# Altium schematic symbol library Regulator_Linear.SchLib: 1452 symbols (part 4 of 10) (continued)
## LM7805_TO220
designator *  value LM7805_TO220
ki_keywords: Voltage Regulator 1A Positive; ki_description: Positive 1A 35V Linear Regulator, Fixed Output 5V, TO-220; ki_fp_filters: TO?220*; Footprint: Package_TO_SOT_THT:TO-220-3_Vertical; Supplier: https://www.onsemi.cn/PowerSolutions/document/MC7800-D.PDF
footprint TO-220-3_Vertical
pins: 1 VI (power), 2 GND (power), 3 VO (power)

## LM7806_TO220
designator *  value LM7806_TO220
ki_keywords: Voltage Regulator 1A Positive; ki_description: Positive 1A 35V Linear Regulator, Fixed Output 6V, TO-220; ki_fp_filters: TO?220*; Footprint: Package_TO_SOT_THT:TO-220-3_Vertical; Supplier: https://www.onsemi.cn/PowerSolutions/document/MC7800-D.PDF
footprint TO-220-3_Vertical
pins: 1 VI (power), 2 GND (power), 3 VO (power)

## LM7808_TO220
designator *  value LM7808_TO220
ki_keywords: Voltage Regulator 1A Positive; ki_description: Positive 1A 35V Linear Regulator, Fixed Output 8V, TO-220; ki_fp_filters: TO?220*; Footprint: Package_TO_SOT_THT:TO-220-3_Vertical; Supplier: https://www.onsemi.cn/PowerSolutions/document/MC7800-D.PDF
footprint TO-220-3_Vertical
pins: 1 VI (power), 2 GND (power), 3 VO (power)

## LM7809_TO220
designator *  value LM7809_TO220
ki_keywords: Voltage Regulator 1A Positive; ki_description: Positive 1A 35V Linear Regulator, Fixed Output 9V, TO-220; ki_fp_filters: TO?220*; Footprint: Package_TO_SOT_THT:TO-220-3_Vertical; Supplier: https://www.onsemi.cn/PowerSolutions/document/MC7800-D.PDF
footprint TO-220-3_Vertical
pins: 1 VI (power), 2 GND (power), 3 VO (power)

## LM7810_TO220
designator *  value LM7810_TO220
ki_keywords: Voltage Regulator 1A Positive; ki_description: Positive 1A 35V Linear Regulator, Fixed Output 10V, TO-220; ki_fp_filters: TO?220*; Footprint: Package_TO_SOT_THT:TO-220-3_Vertical; Supplier: https://www.onsemi.cn/PowerSolutions/document/MC7800-D.PDF
footprint TO-220-3_Vertical
pins: 1 VI (power), 2 GND (power), 3 VO (power)

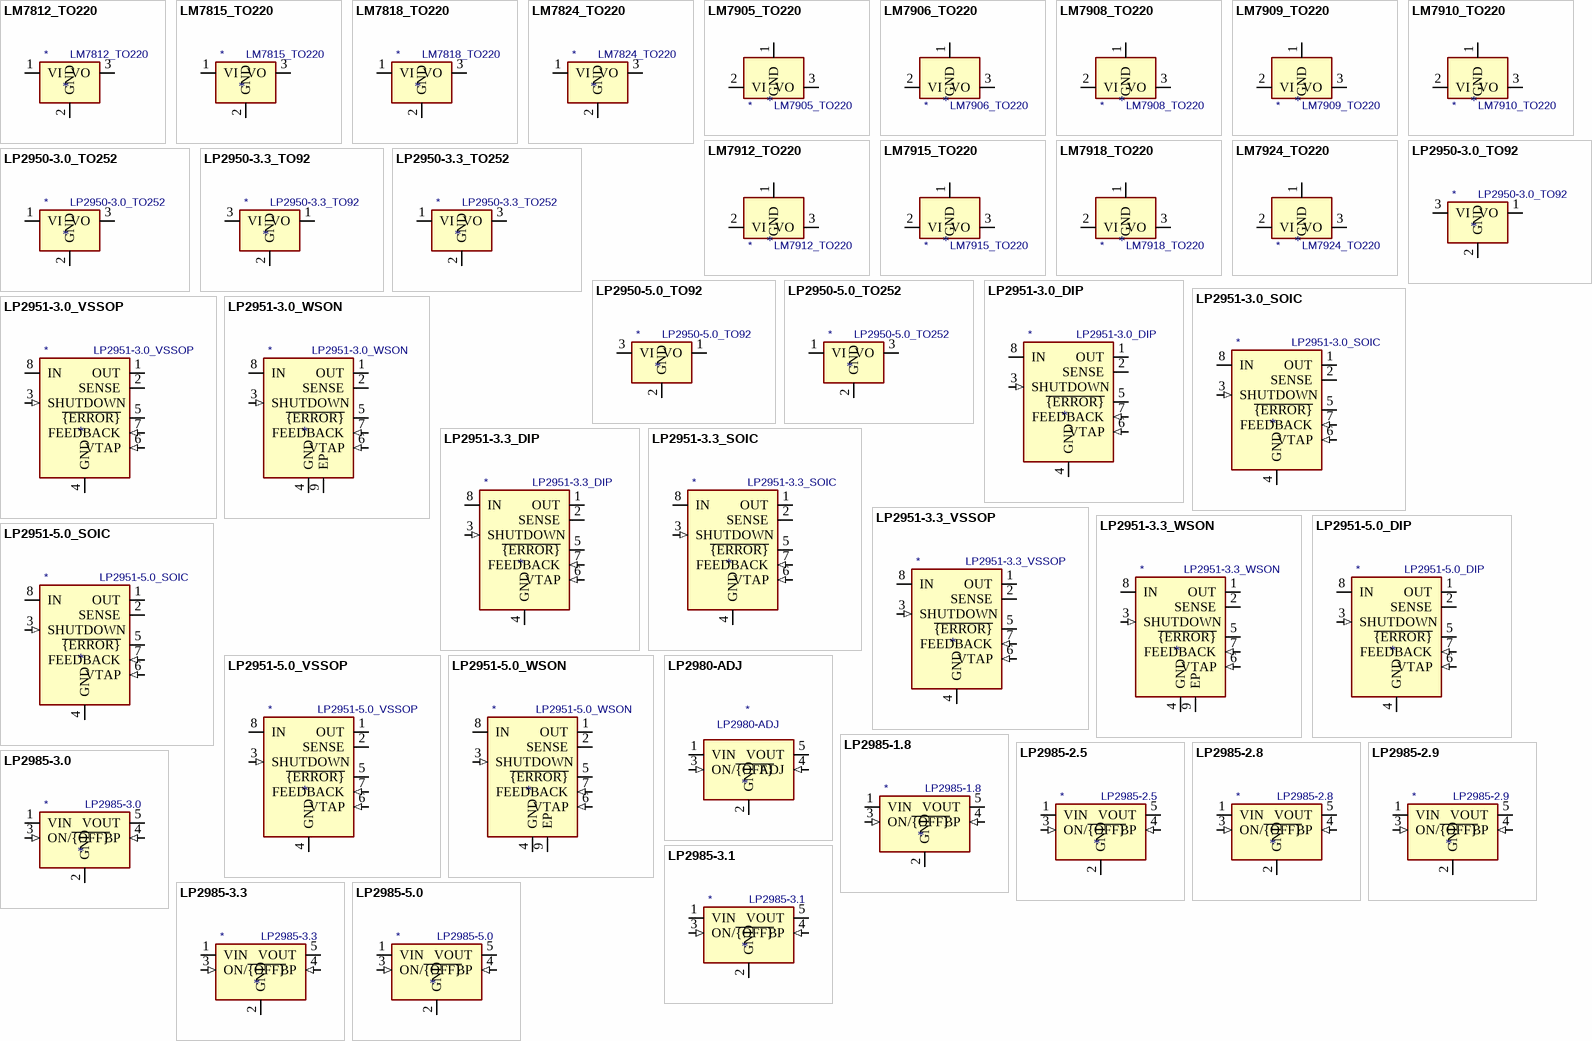
[diagram p14: symbols LM7812_TO220 to LP2985-5.0]

## LM7812_TO220
designator *  value LM7812_TO220
ki_keywords: Voltage Regulator 1A Positive; ki_description: Positive 1A 35V Linear Regulator, Fixed Output 12V, TO-220; ki_fp_filters: TO?220*; Footprint: Package_TO_SOT_THT:TO-220-3_Vertical; Supplier: https://www.onsemi.cn/PowerSolutions/document/MC7800-D.PDF
footprint TO-220-3_Vertical
pins: 1 VI (power), 2 GND (power), 3 VO (power)

## LM7815_TO220
designator *  value LM7815_TO220
ki_keywords: Voltage Regulator 1A Positive; ki_description: Positive 1A 35V Linear Regulator, Fixed Output 15V, TO-220; ki_fp_filters: TO?220*; Footprint: Package_TO_SOT_THT:TO-220-3_Vertical; Supplier: https://www.onsemi.cn/PowerSolutions/document/MC7800-D.PDF
footprint TO-220-3_Vertical
pins: 1 VI (power), 2 GND (power), 3 VO (power)

## LM7818_TO220
designator *  value LM7818_TO220
ki_keywords: Voltage Regulator 1A Positive; ki_description: Positive 1A 35V Linear Regulator, Fixed Output 18V, TO-220; ki_fp_filters: TO?220*; Footprint: Package_TO_SOT_THT:TO-220-3_Vertical; Supplier: https://www.onsemi.cn/PowerSolutions/document/MC7800-D.PDF
footprint TO-220-3_Vertical
pins: 1 VI (power), 2 GND (power), 3 VO (power)

## LM7824_TO220
designator *  value LM7824_TO220
ki_keywords: Voltage Regulator 1A Positive; ki_description: Positive 1A 35V Linear Regulator, Fixed Output 24V, TO-220; ki_fp_filters: TO?220*; Footprint: Package_TO_SOT_THT:TO-220-3_Vertical; Supplier: https://www.onsemi.cn/PowerSolutions/document/MC7800-D.PDF
footprint TO-220-3_Vertical
pins: 1 VI (power), 2 GND (power), 3 VO (power)

## LM7905_TO220
designator *  value LM7905_TO220
ki_keywords: Voltage Regulator 1A Negative; ki_description: Negative 1A 35V Linear Regulator, Fixed Output 5V, TO-220; ki_fp_filters: TO?220*; Footprint: Package_TO_SOT_THT:TO-220-3_Vertical; Supplier: https://www.onsemi.com/pub/Collateral/MC7900-D.PDF
footprint TO-220-3_Vertical
pins: 1 GND (power), 2 VI (power), 3 VO (power)

## LM7906_TO220
designator *  value LM7906_TO220
ki_keywords: Voltage Regulator 1A Negative; ki_description: Negative 1A 35V Linear Regulator, Fixed Output 6V, TO-220; ki_fp_filters: TO?220*; Footprint: Package_TO_SOT_THT:TO-220-3_Vertical; Supplier: https://www.onsemi.com/pub/Collateral/MC7900-D.PDF
footprint TO-220-3_Vertical
pins: 1 GND (power), 2 VI (power), 3 VO (power)

## LM7908_TO220
designator *  value LM7908_TO220
ki_keywords: Voltage Regulator 1A Negative; ki_description: Negative 1A 35V Linear Regulator, Fixed Output 8V, TO-220; ki_fp_filters: TO?220*; Footprint: Package_TO_SOT_THT:TO-220-3_Vertical; Supplier: https://www.onsemi.com/pub/Collateral/MC7900-D.PDF
footprint TO-220-3_Vertical
pins: 1 GND (power), 2 VI (power), 3 VO (power)

## LM7909_TO220
designator *  value LM7909_TO220
ki_keywords: Voltage Regulator 1A Negative; ki_description: Negative 1A 35V Linear Regulator, Fixed Output 9V, TO-220; ki_fp_filters: TO?220*; Footprint: Package_TO_SOT_THT:TO-220-3_Vertical; Supplier: https://www.onsemi.com/pub/Collateral/MC7900-D.PDF
footprint TO-220-3_Vertical
pins: 1 GND (power), 2 VI (power), 3 VO (power)

## LM7910_TO220
designator *  value LM7910_TO220
ki_keywords: Voltage Regulator 1A Negative; ki_description: Negative 1A 35V Linear Regulator, Fixed Output 10V, TO-220; ki_fp_filters: TO?220*; Footprint: Package_TO_SOT_THT:TO-220-3_Vertical; Supplier: https://www.onsemi.com/pub/Collateral/MC7900-D.PDF
footprint TO-220-3_Vertical
pins: 1 GND (power), 2 VI (power), 3 VO (power)

## LM7912_TO220
designator *  value LM7912_TO220
ki_keywords: Voltage Regulator 1A Negative; ki_description: Negative 1A 35V Linear Regulator, Fixed Output 12V, TO-220; ki_fp_filters: TO?220*; Footprint: Package_TO_SOT_THT:TO-220-3_Vertical; Supplier: hhttps://www.onsemi.com/pub/Collateral/MC7900-D.PDF
footprint TO-220-3_Vertical
pins: 1 GND (power), 2 VI (power), 3 VO (power)

## LM7915_TO220
designator *  value LM7915_TO220
ki_keywords: Voltage Regulator 1A Negative; ki_description: Negative 1A 35V Linear Regulator, Fixed Output 15V, TO-220; ki_fp_filters: TO?220*; Footprint: Package_TO_SOT_THT:TO-220-3_Vertical; Supplier: https://www.onsemi.com/pub/Collateral/MC7900-D.PDF
footprint TO-220-3_Vertical
pins: 1 GND (power), 2 VI (power), 3 VO (power)

## LM7918_TO220
designator *  value LM7918_TO220
ki_keywords: Voltage Regulator 1A Negative; ki_description: Negative 1A 35V Linear Regulator, Fixed Output 18V, TO-220; ki_fp_filters: TO?220*; Footprint: Package_TO_SOT_THT:TO-220-3_Vertical; Supplier: https://www.onsemi.com/pub/Collateral/MC7900-D.PDF
footprint TO-220-3_Vertical
pins: 1 GND (power), 2 VI (power), 3 VO (power)

## LM7924_TO220
designator *  value LM7924_TO220
ki_keywords: Voltage Regulator 1A Negative; ki_description: Negative 1A 35V Linear Regulator, Fixed Output 24V, TO-220; ki_fp_filters: TO?220*; Footprint: Package_TO_SOT_THT:TO-220-3_Vertical; Supplier: https://www.onsemi.com/pub/Collateral/MC7900-D.PDF
footprint TO-220-3_Vertical
pins: 1 GND (power), 2 VI (power), 3 VO (power)

## LP2950-3.0_TO92
designator *  value LP2950-3.0_TO92
ki_keywords: Micropower Voltage Regulator 100mA Positive; ki_description: Positive 100mA 30V Linear Micropower Voltage Regulator, Fixed Output 3.0V, TO-92; ki_fp_filters: TO?92*; Footprint: Package_TO_SOT_THT:TO-92_Inline; Supplier: http://www.ti.com/lit/ds/symlink/lp2950.pdf
footprint TO-92_Inline
pins: 1 VO (power), 2 GND (power), 3 VI (power)

## LP2950-3.0_TO252
designator *  value LP2950-3.0_TO252
ki_keywords: Micropower Voltage Regulator 100mA Positive; ki_description: Positive 100mA 30V Linear Micropower Voltage Regulator, Fixed Output 3.0V, TO-252; ki_fp_filters: TO?252*; Footprint: Package_TO_SOT_SMD:TO-252-2; Supplier: http://www.ti.com/lit/ds/symlink/lp2950.pdf
footprint TO-252-2
pins: 1 VI (power), 2 GND (power), 3 VO (power)

## LP2950-3.3_TO92
designator *  value LP2950-3.3_TO92
ki_keywords: Micropower Voltage Regulator 100mA Positive; ki_description: Positive 100mA 30V Linear Micropower Voltage Regulator, Fixed Output 3.3V, TO-92; ki_fp_filters: TO?92*; Footprint: Package_TO_SOT_THT:TO-92_Inline; Supplier: http://www.ti.com/lit/ds/symlink/lp2950.pdf
footprint TO-92_Inline
pins: 1 VO (power), 2 GND (power), 3 VI (power)

## LP2950-3.3_TO252
designator *  value LP2950-3.3_TO252
ki_keywords: Micropower Voltage Regulator 100mA Positive; ki_description: Positive 100mA 30V Linear Micropower Voltage Regulator, Fixed Output 3.3V, TO-252; ki_fp_filters: TO?252*; Footprint: Package_TO_SOT_SMD:TO-252-2; Supplier: http://www.ti.com/lit/ds/symlink/lp2950.pdf
footprint TO-252-2
pins: 1 VI (power), 2 GND (power), 3 VO (power)

## LP2950-5.0_TO92
designator *  value LP2950-5.0_TO92
ki_keywords: Micropower Voltage Regulator 100mA Positive; ki_description: Micropower Voltage Regulators with Shutdown, 100mA, Fixed Output 5.0V, TO-92; ki_fp_filters: TO?92*; Footprint: Package_TO_SOT_THT:TO-92_Inline; Supplier: http://www.ti.com/lit/ds/symlink/lp2951.pdf
footprint TO-92_Inline
pins: 1 VO (power), 2 GND (power), 3 VI (power)

## LP2950-5.0_TO252
designator *  value LP2950-5.0_TO252
ki_keywords: Micropower Voltage Regulator 100mA Positive; ki_description: Positive 100mA 30V Linear Micropower Voltage Regulator, Fixed Output 5.0V, TO-252; ki_fp_filters: TO?252*; Footprint: Package_TO_SOT_SMD:TO-252-2; Supplier: http://www.ti.com/lit/ds/symlink/lp2950.pdf
footprint TO-252-2
pins: 1 VI (power), 2 GND (power), 3 VO (power)

## LP2951-3.0_DIP
designator *  value LP2951-3.0_DIP
ki_keywords: Micropower Voltage Regulators with Shutdown; ki_description: Micropower Voltage Regulators with Shutdown, 100mA, Fixed Output 3.0V, LDO, DIP-8; ki_fp_filters: DIP*W7.62mm*; Footprint: Package_DIP:DIP-8_W7.62mm; Supplier: http://www.ti.com/lit/ds/symlink/lp2951.pdf
footprint DIP-8_W7.62mm
pins: 1 OUT (power), 2 SENSE, 3 SHUTDOWN (in), 4 GND (power), 5 ~{{ERROR}} (oc), 6 VTAP (in), 7 FEEDBACK (in), 8 IN (power)

## LP2951-3.0_SOIC
designator *  value LP2951-3.0_SOIC
ki_keywords: Micropower Voltage Regulators with Shutdown; ki_description: Micropower Voltage Regulators with Shutdown, 100mA, Fixed Output 3.0V, LDO, SOIC-8; ki_fp_filters: SOIC*3.9x4.9mm*P1.27mm*; Footprint: Package_SO:SOIC-8_3.9x4.9mm_P1.27mm; Supplier: http://www.ti.com/lit/ds/symlink/lp2951.pdf
footprint SOIC-8_3.9x4.9mm_P1.27mm
pins: 1 OUT (power), 2 SENSE, 3 SHUTDOWN (in), 4 GND (power), 5 ~{{ERROR}} (oc), 6 VTAP (in), 7 FEEDBACK (in), 8 IN (power)

## LP2951-3.0_VSSOP
designator *  value LP2951-3.0_VSSOP
ki_keywords: Micropower Voltage Regulators with Shutdown; ki_description: Micropower Voltage Regulators with Shutdown, 100mA, Fixed Output 3.0V, LDO, VSSOP-8; ki_fp_filters: VSSOP*3.0x3.0mm*P0.65mm*; Footprint: Package_SO:VSSOP-8_3.0x3.0mm_P0.65mm; Supplier: http://www.ti.com/lit/ds/symlink/lp2951.pdf
footprint VSSOP-8_3.0x3.0mm_P0.65mm
pins: 1 OUT (power), 2 SENSE, 3 SHUTDOWN (in), 4 GND (power), 5 ~{{ERROR}} (oc), 6 VTAP (in), 7 FEEDBACK (in), 8 IN (power)

## LP2951-3.0_WSON
designator *  value LP2951-3.0_WSON
ki_keywords: Micropower Voltage Regulators with Shutdown; ki_description: Micropower Voltage Regulators with Shutdown, 100mA, Fixed Output 3.0V, LDO, WSON-8; ki_fp_filters: WSON*1EP*3x3mm*P0.5mm*; Footprint: Package_SON:WSON-8-1EP_3x3mm_P0.5mm_EP1.2x2mm; Supplier: http://www.ti.com/lit/ds/symlink/lp2951.pdf
footprint WSON-8-1EP_3x3mm_P0.5mm_EP1.2x2mm
pins: 1 OUT (power), 2 SENSE, 3 SHUTDOWN (in), 4 GND (power), 5 ~{{ERROR}} (oc), 6 VTAP (in), 7 FEEDBACK (in), 8 IN (power), 9 EP

## LP2951-3.3_DIP
designator *  value LP2951-3.3_DIP
ki_keywords: Micropower Voltage Regulators with Shutdown; ki_description: Micropower Voltage Regulators with Shutdown, 100mA, Fixed Output 3.3V, LDO, DIP-8; ki_fp_filters: DIP*W7.62mm*; Footprint: Package_DIP:DIP-8_W7.62mm; Supplier: http://www.ti.com/lit/ds/symlink/lp2951.pdf
footprint DIP-8_W7.62mm
pins: 1 OUT (power), 2 SENSE, 3 SHUTDOWN (in), 4 GND (power), 5 ~{{ERROR}} (oc), 6 VTAP (in), 7 FEEDBACK (in), 8 IN (power)

## LP2951-3.3_SOIC
designator *  value LP2951-3.3_SOIC
ki_keywords: Micropower Voltage Regulators with Shutdown; ki_description: Micropower Voltage Regulators with Shutdown, 100mA, Fixed Output 3.3V, LDO, SOIC-8; ki_fp_filters: SOIC*3.9x4.9mm*P1.27mm*; Footprint: Package_SO:SOIC-8_3.9x4.9mm_P1.27mm; Supplier: http://www.ti.com/lit/ds/symlink/lp2951.pdf
footprint SOIC-8_3.9x4.9mm_P1.27mm
pins: 1 OUT (power), 2 SENSE, 3 SHUTDOWN (in), 4 GND (power), 5 ~{{ERROR}} (oc), 6 VTAP (in), 7 FEEDBACK (in), 8 IN (power)

## LP2951-3.3_VSSOP
designator *  value LP2951-3.3_VSSOP
ki_keywords: Micropower Voltage Regulators with Shutdown; ki_description: Micropower Voltage Regulators with Shutdown, 100mA, Fixed Output 3.3V, LDO, VSSOP-8; ki_fp_filters: VSSOP*3.0x3.0mm*P0.65mm*; Footprint: Package_SO:VSSOP-8_3.0x3.0mm_P0.65mm; Supplier: http://www.ti.com/lit/ds/symlink/lp2951.pdf
footprint VSSOP-8_3.0x3.0mm_P0.65mm
pins: 1 OUT (power), 2 SENSE, 3 SHUTDOWN (in), 4 GND (power), 5 ~{{ERROR}} (oc), 6 VTAP (in), 7 FEEDBACK (in), 8 IN (power)

## LP2951-3.3_WSON
designator *  value LP2951-3.3_WSON
ki_keywords: Micropower Voltage Regulators with Shutdown; ki_description: Micropower Voltage Regulators with Shutdown, 100mA, Fixed Output 3.3V, LDO, WSON-8; ki_fp_filters: WSON*1EP*3x3mm*P0.5mm*; Footprint: Package_SON:WSON-8-1EP_3x3mm_P0.5mm_EP1.2x2mm; Supplier: http://www.ti.com/lit/ds/symlink/lp2951.pdf
footprint WSON-8-1EP_3x3mm_P0.5mm_EP1.2x2mm
pins: 1 OUT (power), 2 SENSE, 3 SHUTDOWN (in), 4 GND (power), 5 ~{{ERROR}} (oc), 6 VTAP (in), 7 FEEDBACK (in), 8 IN (power), 9 EP

## LP2951-5.0_DIP
designator *  value LP2951-5.0_DIP
ki_keywords: Micropower Voltage Regulators with Shutdown; ki_description: Micropower Voltage Regulators with Shutdown, 100mA, Fixed Output 5.0V, LDO, DIP-8; ki_fp_filters: DIP*W7.62mm*; Footprint: Package_DIP:DIP-8_W7.62mm; Supplier: http://www.ti.com/lit/ds/symlink/lp2951.pdf
footprint DIP-8_W7.62mm
pins: 1 OUT (power), 2 SENSE, 3 SHUTDOWN (in), 4 GND (power), 5 ~{{ERROR}} (oc), 6 VTAP (in), 7 FEEDBACK (in), 8 IN (power)

## LP2951-5.0_SOIC
designator *  value LP2951-5.0_SOIC
ki_keywords: Micropower Voltage Regulators with Shutdown; ki_description: Micropower Voltage Regulators with Shutdown, 100mA, Fixed Output 5.0V, LDO, SOIC-8; ki_fp_filters: SOIC*3.9x4.9mm*P1.27mm*; Footprint: Package_SO:SOIC-8_3.9x4.9mm_P1.27mm; Supplier: http://www.ti.com/lit/ds/symlink/lp2951.pdf
footprint SOIC-8_3.9x4.9mm_P1.27mm
pins: 1 OUT (power), 2 SENSE, 3 SHUTDOWN (in), 4 GND (power), 5 ~{{ERROR}} (oc), 6 VTAP (in), 7 FEEDBACK (in), 8 IN (power)

## LP2951-5.0_VSSOP
designator *  value LP2951-5.0_VSSOP
ki_keywords: Micropower Voltage Regulators with Shutdown; ki_description: Micropower Voltage Regulators with Shutdown, 100mA, Fixed Output 5.0V, LDO, VSSOP-8; ki_fp_filters: VSSOP*3.0x3.0mm*P0.65mm*; Footprint: Package_SO:VSSOP-8_3.0x3.0mm_P0.65mm; Supplier: http://www.ti.com/lit/ds/symlink/lp2951.pdf
footprint VSSOP-8_3.0x3.0mm_P0.65mm
pins: 1 OUT (power), 2 SENSE, 3 SHUTDOWN (in), 4 GND (power), 5 ~{{ERROR}} (oc), 6 VTAP (in), 7 FEEDBACK (in), 8 IN (power)

## LP2951-5.0_WSON
designator *  value LP2951-5.0_WSON
ki_keywords: Micropower Voltage Regulators with Shutdown; ki_description: Micropower Voltage Regulators with Shutdown, 100mA, Fixed Output 5.0V, LDO, WSON-8; ki_fp_filters: WSON*1EP*3x3mm*P0.5mm*; Footprint: Package_SON:WSON-8-1EP_3x3mm_P0.5mm_EP1.2x2mm; Supplier: http://www.ti.com/lit/ds/symlink/lp2951.pdf
footprint WSON-8-1EP_3x3mm_P0.5mm_EP1.2x2mm
pins: 1 OUT (power), 2 SENSE, 3 SHUTDOWN (in), 4 GND (power), 5 ~{{ERROR}} (oc), 6 VTAP (in), 7 FEEDBACK (in), 8 IN (power), 9 EP

## LP2980-ADJ
designator *  value LP2980-ADJ
ki_keywords: LDO Voltage Regulator 50mA Positive; ki_description: 50mA 15V Low-noise Low-dropout Regulator, 1.23-15V adjustable output voltage, SOT-23-5; ki_fp_filters: SOT?23*; Footprint: Package_TO_SOT_SMD:SOT-23-5; Supplier: http://www.ti.com/lit/ds/symlink/lp2980-adj.pdf
footprint SOT-23-5
pins: 1 VIN (power), 2 GND (power), 3 ON/~{{OFF}} (in), 4 ADJ (in), 5 VOUT (power)

## LP2985-1.8
designator *  value LP2985-1.8
ki_keywords: LDO regulator linear  SOT-23-5; ki_description: 150mA 16V Low-noise Low-dropout Regulator With Shutdown, 1.8V output voltage, SOT-23-5; ki_fp_filters: SOT?23*; Footprint: Package_TO_SOT_SMD:SOT-23-5; Supplier: http://www.ti.com/lit/ds/symlink/lp2985.pdf
footprint SOT-23-5
pins: 1 VIN (power), 2 GND (power), 3 ON/~{{OFF}} (in), 4 BP (in), 5 VOUT (power)

## LP2985-2.5
designator *  value LP2985-2.5
ki_keywords: LDO regulator linear  SOT-23-5; ki_description: 150mA 16V Low-noise Low-dropout Regulator With Shutdown, 2.5V output voltage, SOT-23-5; ki_fp_filters: SOT?23*; Footprint: Package_TO_SOT_SMD:SOT-23-5; Supplier: http://www.ti.com/lit/ds/symlink/lp2985.pdf
footprint SOT-23-5
pins: 1 VIN (power), 2 GND (power), 3 ON/~{{OFF}} (in), 4 BP (in), 5 VOUT (power)

## LP2985-2.8
designator *  value LP2985-2.8
ki_keywords: LDO regulator linear  SOT-23-5; ki_description: 150mA 16V Low-noise Low-dropout Regulator With Shutdown, 2.8V output voltage, SOT-23-5; ki_fp_filters: SOT?23*; Footprint: Package_TO_SOT_SMD:SOT-23-5; Supplier: http://www.ti.com/lit/ds/symlink/lp2985.pdf
footprint SOT-23-5
pins: 1 VIN (power), 2 GND (power), 3 ON/~{{OFF}} (in), 4 BP (in), 5 VOUT (power)

## LP2985-2.9
designator *  value LP2985-2.9
ki_keywords: LDO regulator linear  SOT-23-5; ki_description: 150mA 16V Low-noise Low-dropout Regulator With Shutdown, 2.9V output voltage, SOT-23-5; ki_fp_filters: SOT?23*; Footprint: Package_TO_SOT_SMD:SOT-23-5; Supplier: http://www.ti.com/lit/ds/symlink/lp2985.pdf
footprint SOT-23-5
pins: 1 VIN (power), 2 GND (power), 3 ON/~{{OFF}} (in), 4 BP (in), 5 VOUT (power)

## LP2985-3.0
designator *  value LP2985-3.0
ki_keywords: LDO regulator linear  SOT-23-5; ki_description: 150mA 16V Low-noise Low-dropout Regulator With Shutdown, 3.0V output voltage, SOT-23-5; ki_fp_filters: SOT?23*; Footprint: Package_TO_SOT_SMD:SOT-23-5; Supplier: http://www.ti.com/lit/ds/symlink/lp2985.pdf
footprint SOT-23-5
pins: 1 VIN (power), 2 GND (power), 3 ON/~{{OFF}} (in), 4 BP (in), 5 VOUT (power)

## LP2985-3.1
designator *  value LP2985-3.1
ki_keywords: LDO regulator linear  SOT-23-5; ki_description: 150mA 16V Low-noise Low-dropout Regulator With Shutdown, 3.1V output voltage, SOT-23-5; ki_fp_filters: SOT?23*; Footprint: Package_TO_SOT_SMD:SOT-23-5; Supplier: http://www.ti.com/lit/ds/symlink/lp2985.pdf
footprint SOT-23-5
pins: 1 VIN (power), 2 GND (power), 3 ON/~{{OFF}} (in), 4 BP (in), 5 VOUT (power)

## LP2985-3.3
designator *  value LP2985-3.3
ki_keywords: LDO regulator linear  SOT-23-5; ki_description: 150mA 16V Low-noise Low-dropout Regulator With Shutdown, 3.3V output voltage, SOT-23-5; ki_fp_filters: SOT?23*; Footprint: Package_TO_SOT_SMD:SOT-23-5; Supplier: http://www.ti.com/lit/ds/symlink/lp2985.pdf
footprint SOT-23-5
pins: 1 VIN (power), 2 GND (power), 3 ON/~{{OFF}} (in), 4 BP (in), 5 VOUT (power)

## LP2985-5.0
designator *  value LP2985-5.0
ki_keywords: LDO regulator linear  SOT-23-5; ki_description: 150mA 16V Low-noise Low-dropout Regulator With Shutdown, 5.0V output voltage, SOT-23-5; ki_fp_filters: SOT?23*; Footprint: Package_TO_SOT_SMD:SOT-23-5; Supplier: http://www.ti.com/lit/ds/symlink/lp2985.pdf
footprint SOT-23-5
pins: 1 VIN (power), 2 GND (power), 3 ON/~{{OFF}} (in), 4 BP (in), 5 VOUT (power)

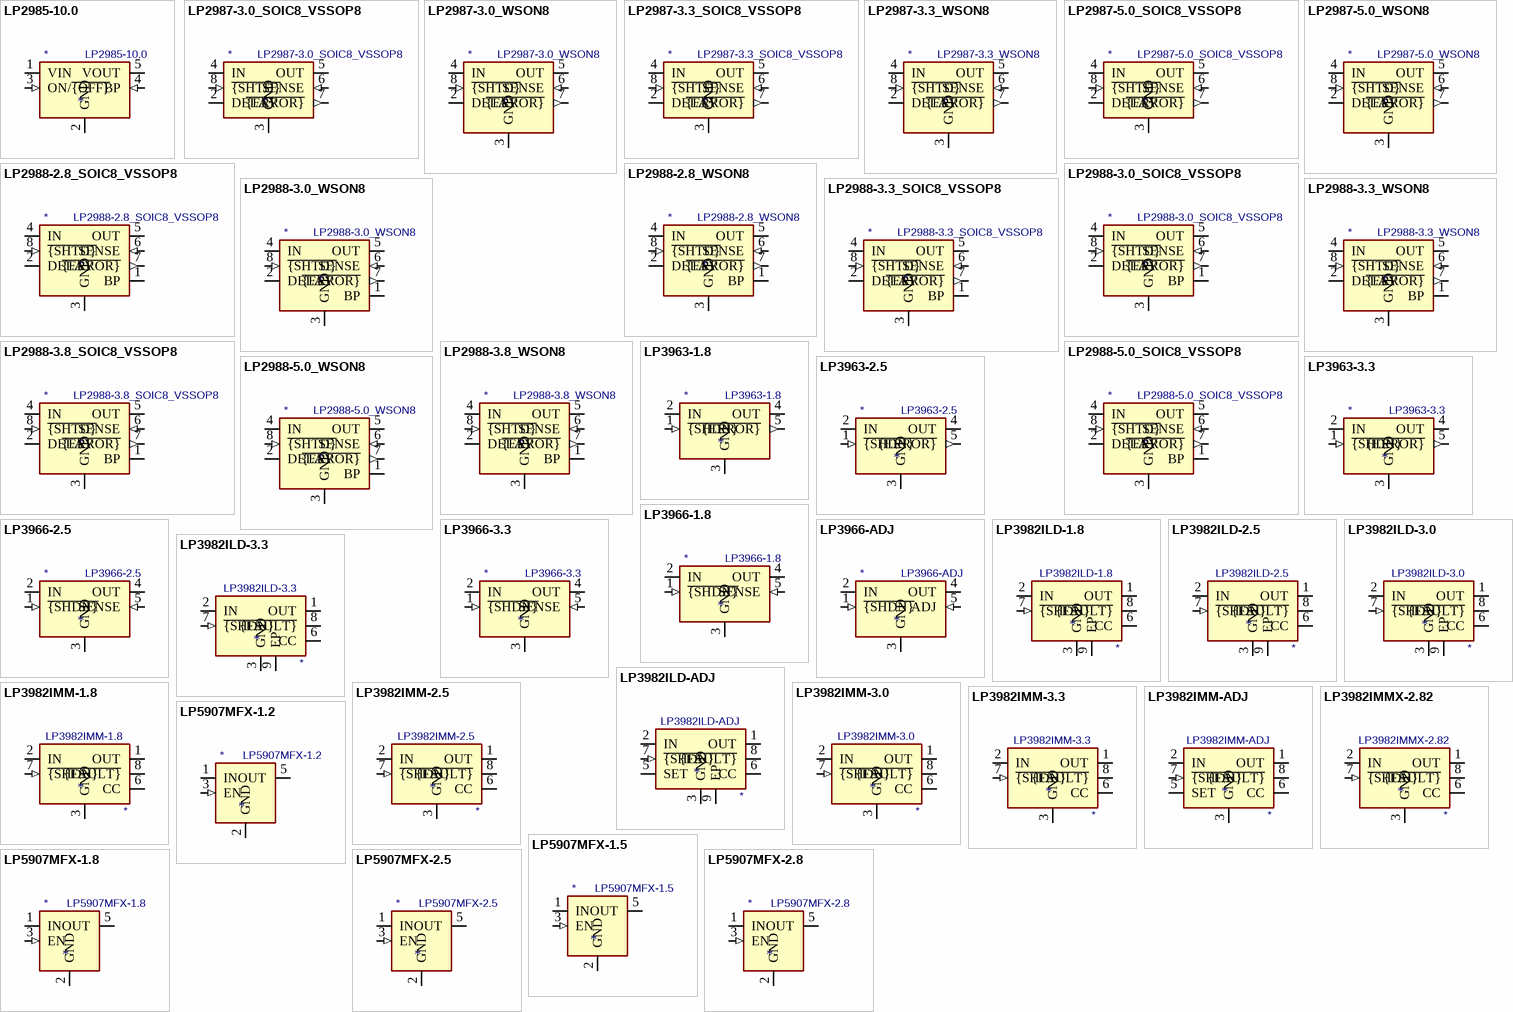
[diagram p15: symbols LP2985-10.0 to LP5907MFX-2.8]

## LP2985-10.0
designator *  value LP2985-10.0
ki_keywords: LDO regulator linear  SOT-23-5; ki_description: 150mA 16V Low-noise Low-dropout Regulator With Shutdown, 10.0V output voltage, SOT-23-5; ki_fp_filters: SOT?23*; Footprint: Package_TO_SOT_SMD:SOT-23-5; Supplier: http://www.ti.com/lit/ds/symlink/lp2985.pdf
footprint SOT-23-5
pins: 1 VIN (power), 2 GND (power), 3 ON/~{{OFF}} (in), 4 BP (in), 5 VOUT (power)

## LP2987-3.0_SOIC8_VSSOP8
designator *  value LP2987-3.0_SOIC8_VSSOP8
ki_keywords: Linear LDO Regulator 200mA 5V; ki_description: 200mA Linear LDO Regulator, MicroPower, Fixed Output 3.0V, SO8/MSOP8; ki_fp_filters: MSOP*3x3mm*P0.65mm* SOIC*3.9x4.9mm*P1.27mm*; Supplier: http://www.ti.com/lit/ds/symlink/lp2987.pdf
pins: 1 NC (in) hidden, 2 DELAY, 3 GND (power), 4 IN (power), 5 OUT (power), 6 SENSE (in), 7 ~{{ERROR}} (out), 8 ~{{SHTD}} (in)

## LP2987-3.0_WSON8
designator *  value LP2987-3.0_WSON8
ki_keywords: Linear LDO Regulator 200mA 5V; ki_description: 200mA Linear LDO Regulator, MicroPower, Fixed Output 3.0V, WSON-8; ki_fp_filters: WSON*1EP*4x4mm*P0.8mm*; Footprint: Package_SON:WSON-8-1EP_4x4mm_P0.8mm_EP2.2x3mm; Supplier: http://www.ti.com/lit/ds/symlink/lp2987.pdf
footprint WSON-8-1EP_4x4mm_P0.8mm_EP2.2x3mm
pins: 1 NC (in) hidden, 2 DELAY, 3 GND (power), 4 IN (power), 5 OUT (power), 6 SENSE (in), 7 ~{{ERROR}} (out), 8 ~{{SHTD}} (in), 9 GND hidden

## LP2987-3.3_SOIC8_VSSOP8
designator *  value LP2987-3.3_SOIC8_VSSOP8
ki_keywords: Linear LDO Regulator 200mA 5V; ki_description: 200mA Linear LDO Regulator, MicroPower, Fixed Output 3.3V, SO8/MSOP8; ki_fp_filters: MSOP*3x3mm*P0.65mm* SOIC*3.9x4.9mm*P1.27mm*; Supplier: http://www.ti.com/lit/ds/symlink/lp2987.pdf
pins: 1 NC (in) hidden, 2 DELAY, 3 GND (power), 4 IN (power), 5 OUT (power), 6 SENSE (in), 7 ~{{ERROR}} (out), 8 ~{{SHTD}} (in)

## LP2987-3.3_WSON8
designator *  value LP2987-3.3_WSON8
ki_keywords: Linear LDO Regulator 200mA 5V; ki_description: 200mA Linear LDO Regulator, MicroPower, Fixed Output 3.3V, WSON-8; ki_fp_filters: WSON*1EP*4x4mm*P0.8mm*; Footprint: Package_SON:WSON-8-1EP_4x4mm_P0.8mm_EP2.2x3mm; Supplier: http://www.ti.com/lit/ds/symlink/lp2987.pdf
footprint WSON-8-1EP_4x4mm_P0.8mm_EP2.2x3mm
pins: 1 NC (in) hidden, 2 DELAY, 3 GND (power), 4 IN (power), 5 OUT (power), 6 SENSE (in), 7 ~{{ERROR}} (out), 8 ~{{SHTD}} (in), 9 GND hidden

## LP2987-5.0_SOIC8_VSSOP8
designator *  value LP2987-5.0_SOIC8_VSSOP8
ki_keywords: Linear LDO Regulator 200mA 5V; ki_description: 200mA Linear LDO Regulator, MicroPower, Fixed Output 5.0V, SO8/MSOP8; ki_fp_filters: MSOP*3x3mm*P0.65mm* SOIC*3.9x4.9mm*P1.27mm*; Supplier: http://www.ti.com/lit/ds/symlink/lp2987.pdf
pins: 1 NC (in) hidden, 2 DELAY, 3 GND (power), 4 IN (power), 5 OUT (power), 6 SENSE (in), 7 ~{{ERROR}} (out), 8 ~{{SHTD}} (in)

## LP2987-5.0_WSON8
designator *  value LP2987-5.0_WSON8
ki_keywords: Linear LDO Regulator 200mA 5V; ki_description: 200mA Linear LDO Regulator, MicroPower, Fixed Output 5.0V, WSON-8; ki_fp_filters: WSON*1EP*4x4mm*P0.8mm*; Footprint: Package_SON:WSON-8-1EP_4x4mm_P0.8mm_EP2.2x3mm; Supplier: http://www.ti.com/lit/ds/symlink/lp2987.pdf
footprint WSON-8-1EP_4x4mm_P0.8mm_EP2.2x3mm
pins: 1 NC (in) hidden, 2 DELAY, 3 GND (power), 4 IN (power), 5 OUT (power), 6 SENSE (in), 7 ~{{ERROR}} (out), 8 ~{{SHTD}} (in), 9 GND hidden

## LP2988-2.8_SOIC8_VSSOP8
designator *  value LP2988-2.8_SOIC8_VSSOP8
ki_keywords: Linear LDO Regulator 200mA 5V; ki_description: 200mA Linear LDO Regulator, Low Noise, MicroPower, Fixed Output 2.8V, SO8/MSOP8; ki_fp_filters: MSOP*3x3mm*P0.65mm* SOIC*3.9x4.9mm*P1.27mm*; Supplier: http://www.ti.com/lit/ds/symlink/lp2987.pdf
pins: 1 BP, 2 DELAY, 3 GND (power), 4 IN (power), 5 OUT (power), 6 SENSE (in), 7 ~{{ERROR}} (out), 8 ~{{SHTD}} (in)

## LP2988-2.8_WSON8
designator *  value LP2988-2.8_WSON8
ki_keywords: Linear LDO Regulator 200mA 5V; ki_description: 200mA Linear LDO Regulator, Low Noise, MicroPower, Fixed Output 2.8V, WSON-8; ki_fp_filters: WSON*1EP*4x4mm*P0.8mm*; Footprint: Package_SON:WSON-8-1EP_4x4mm_P0.8mm_EP2.2x3mm; Supplier: http://www.ti.com/lit/ds/symlink/lp2987.pdf
footprint WSON-8-1EP_4x4mm_P0.8mm_EP2.2x3mm
pins: 1 BP, 2 DELAY, 3 GND (power), 4 IN (power), 5 OUT (power), 6 SENSE (in), 7 ~{{ERROR}} (out), 8 ~{{SHTD}} (in), 9 GND hidden

## LP2988-3.0_SOIC8_VSSOP8
designator *  value LP2988-3.0_SOIC8_VSSOP8
ki_keywords: Linear LDO Regulator 200mA 5V; ki_description: 200mA Linear LDO Regulator, Low Noise, MicroPower, Fixed Output 3.0V, SO8/MSOP8; ki_fp_filters: MSOP*3x3mm*P0.65mm* SOIC*3.9x4.9mm*P1.27mm*; Supplier: http://www.ti.com/lit/ds/symlink/lp2987.pdf
pins: 1 BP, 2 DELAY, 3 GND (power), 4 IN (power), 5 OUT (power), 6 SENSE (in), 7 ~{{ERROR}} (out), 8 ~{{SHTD}} (in)

## LP2988-3.0_WSON8
designator *  value LP2988-3.0_WSON8
ki_keywords: Linear LDO Regulator 200mA 5V; ki_description: 200mA Linear LDO Regulator, Low Noise, MicroPower, Fixed Output 3.0V, WSON-8; ki_fp_filters: WSON*1EP*4x4mm*P0.8mm*; Footprint: Package_SON:WSON-8-1EP_4x4mm_P0.8mm_EP2.2x3mm; Supplier: http://www.ti.com/lit/ds/symlink/lp2987.pdf
footprint WSON-8-1EP_4x4mm_P0.8mm_EP2.2x3mm
pins: 1 BP, 2 DELAY, 3 GND (power), 4 IN (power), 5 OUT (power), 6 SENSE (in), 7 ~{{ERROR}} (out), 8 ~{{SHTD}} (in), 9 GND hidden

## LP2988-3.3_SOIC8_VSSOP8
designator *  value LP2988-3.3_SOIC8_VSSOP8
ki_keywords: Linear LDO Regulator 200mA 5V; ki_description: 200mA Linear LDO Regulator, Low Noise, MicroPower, Fixed Output 3.3V, SO8/MSOP8; ki_fp_filters: MSOP*3x3mm*P0.65mm* SOIC*3.9x4.9mm*P1.27mm*; Supplier: http://www.ti.com/lit/ds/symlink/lp2987.pdf
pins: 1 BP, 2 DELAY, 3 GND (power), 4 IN (power), 5 OUT (power), 6 SENSE (in), 7 ~{{ERROR}} (out), 8 ~{{SHTD}} (in)

## LP2988-3.3_WSON8
designator *  value LP2988-3.3_WSON8
ki_keywords: Linear LDO Regulator 200mA 5V; ki_description: 200mA Linear LDO Regulator, Low Noise, MicroPower, Fixed Output 3.3V, WSON-8; ki_fp_filters: WSON*1EP*4x4mm*P0.8mm*; Footprint: Package_SON:WSON-8-1EP_4x4mm_P0.8mm_EP2.2x3mm; Supplier: http://www.ti.com/lit/ds/symlink/lp2987.pdf
footprint WSON-8-1EP_4x4mm_P0.8mm_EP2.2x3mm
pins: 1 BP, 2 DELAY, 3 GND (power), 4 IN (power), 5 OUT (power), 6 SENSE (in), 7 ~{{ERROR}} (out), 8 ~{{SHTD}} (in), 9 GND hidden

## LP2988-3.8_SOIC8_VSSOP8
designator *  value LP2988-3.8_SOIC8_VSSOP8
ki_keywords: Linear LDO Regulator 200mA 5V; ki_description: 200mA Linear LDO Regulator, Low Noise, MicroPower, Fixed Output 3.8V, SO8/MSOP8; ki_fp_filters: MSOP*3x3mm*P0.65mm* SOIC*3.9x4.9mm*P1.27mm*; Supplier: http://www.ti.com/lit/ds/symlink/lp2987.pdf
pins: 1 BP, 2 DELAY, 3 GND (power), 4 IN (power), 5 OUT (power), 6 SENSE (in), 7 ~{{ERROR}} (out), 8 ~{{SHTD}} (in)

## LP2988-3.8_WSON8
designator *  value LP2988-3.8_WSON8
ki_keywords: Linear LDO Regulator 200mA 5V; ki_description: 200mA Linear LDO Regulator, Low Noise, MicroPower, Fixed Output 3.8V, WSON-8; ki_fp_filters: WSON*1EP*4x4mm*P0.8mm*; Footprint: Package_SON:WSON-8-1EP_4x4mm_P0.8mm_EP2.2x3mm; Supplier: http://www.ti.com/lit/ds/symlink/lp2987.pdf
footprint WSON-8-1EP_4x4mm_P0.8mm_EP2.2x3mm
pins: 1 BP, 2 DELAY, 3 GND (power), 4 IN (power), 5 OUT (power), 6 SENSE (in), 7 ~{{ERROR}} (out), 8 ~{{SHTD}} (in), 9 GND hidden

## LP2988-5.0_SOIC8_VSSOP8
designator *  value LP2988-5.0_SOIC8_VSSOP8
ki_keywords: Linear LDO Regulator 200mA 5V; ki_description: 200mA Linear LDO Regulator, Low Noise, MicroPower, Fixed Output 5.0V, SO8/MSOP8; ki_fp_filters: MSOP*3x3mm*P0.65mm* SOIC*3.9x4.9mm*P1.27mm*; Supplier: http://www.ti.com/lit/ds/symlink/lp2987.pdf
pins: 1 BP, 2 DELAY, 3 GND (power), 4 IN (power), 5 OUT (power), 6 SENSE (in), 7 ~{{ERROR}} (out), 8 ~{{SHTD}} (in)

## LP2988-5.0_WSON8
designator *  value LP2988-5.0_WSON8
ki_keywords: Linear LDO Regulator 200mA 5V; ki_description: 200mA Linear LDO Regulator, Low Noise, MicroPower, Fixed Output 5.0V, WSON-8; ki_fp_filters: WSON*1EP*4x4mm*P0.8mm*; Footprint: Package_SON:WSON-8-1EP_4x4mm_P0.8mm_EP2.2x3mm; Supplier: http://www.ti.com/lit/ds/symlink/lp2987.pdf
footprint WSON-8-1EP_4x4mm_P0.8mm_EP2.2x3mm
pins: 1 BP, 2 DELAY, 3 GND (power), 4 IN (power), 5 OUT (power), 6 SENSE (in), 7 ~{{ERROR}} (out), 8 ~{{SHTD}} (in), 9 GND hidden

## LP3963-1.8
designator *  value LP3963-1.8
ki_keywords: LDO Linear Regulator; ki_description: 3A Fast Ultra Low Dropout Linear Regulator, 1.8V output voltage, TO-220-5/TO-263-5; ki_fp_filters: TO?220*Vertical*StaggerOdd* TO?263*TabPin3*; Supplier: http://www.ti.com/lit/ds/symlink/lp3966.pdf
pins: 1 ~{{SHDN}} (in), 2 IN (power), 3 GND (power), 4 OUT (power), 5 ~{{ERROR}} (out)

## LP3963-2.5
designator *  value LP3963-2.5
ki_keywords: LDO Linear Regulator; ki_description: 3A Fast Ultra Low Dropout Linear Regulator, 2.5V output voltage, TO-220-5/TO-263-5; ki_fp_filters: TO?220*Vertical*StaggerOdd* TO?263*TabPin3*; Supplier: http://www.ti.com/lit/ds/symlink/lp3966.pdf
pins: 1 ~{{SHDN}} (in), 2 IN (power), 3 GND (power), 4 OUT (power), 5 ~{{ERROR}} (out)

## LP3963-3.3
designator *  value LP3963-3.3
ki_keywords: LDO Linear Regulator; ki_description: 3A Fast Ultra Low Dropout Linear Regulator, 3.3V output voltage, TO-220-5/TO-263-5; ki_fp_filters: TO?220*Vertical*StaggerOdd* TO?263*TabPin3*; Supplier: http://www.ti.com/lit/ds/symlink/lp3966.pdf
pins: 1 ~{{SHDN}} (in), 2 IN (power), 3 GND (power), 4 OUT (power), 5 ~{{ERROR}} (out)

## LP3966-1.8
designator *  value LP3966-1.8
ki_keywords: LDO Linear Regulator; ki_description: 3A Fast Ultra Low Dropout Linear Regulator, 1.8V output voltage, TO-220-5/TO-263-5; ki_fp_filters: TO?220*Vertical*StaggerOdd* TO?263*TabPin3*; Supplier: http://www.ti.com/lit/ds/symlink/lp3966.pdf
pins: 1 ~{{SHDN}} (in), 2 IN (power), 3 GND (power), 4 OUT (power), 5 SENSE (in)

## LP3966-2.5
designator *  value LP3966-2.5
ki_keywords: LDO Linear Regulator; ki_description: 3A Fast Ultra Low Dropout Linear Regulator, 2.5V output voltage, TO-220-5/TO-263-5; ki_fp_filters: TO?220*Vertical*StaggerOdd* TO?263*TabPin3*; Supplier: http://www.ti.com/lit/ds/symlink/lp3966.pdf
pins: 1 ~{{SHDN}} (in), 2 IN (power), 3 GND (power), 4 OUT (power), 5 SENSE (in)

## LP3966-3.3
designator *  value LP3966-3.3
ki_keywords: LDO Linear Regulator; ki_description: 3A Fast Ultra Low Dropout Linear Regulator, 3.3V output voltage, TO-220-5/TO-263-5; ki_fp_filters: TO?220*Vertical*StaggerOdd* TO?263*TabPin3*; Supplier: http://www.ti.com/lit/ds/symlink/lp3966.pdf
pins: 1 ~{{SHDN}} (in), 2 IN (power), 3 GND (power), 4 OUT (power), 5 SENSE (in)

## LP3966-ADJ
designator *  value LP3966-ADJ
ki_keywords: LDO Linear Regulator adjustable; ki_description: 3A Fast Ultra Low Dropout Linear Regulator, adjustable output voltage, TO-220-5/TO-263-5; ki_fp_filters: TO?220*Vertical*StaggerOdd* TO?263*TabPin3*; Supplier: http://www.ti.com/lit/ds/symlink/lp3966.pdf
pins: 1 ~{{SHDN}} (in), 2 IN (power), 3 GND (power), 4 OUT (power), 5 ADJ (in)

## LP3982ILD-1.8
designator *  value LP3982ILD-1.8
ki_keywords: linear regulator; ki_description: 1.8V, 300mA, Micropower, Ultra-Low-Dropout, Low-Noise CMOS Regulator, WSON-8; ki_fp_filters: WSON*1EP*3x2.5mm*P0.5mm*; Footprint: Package_SON:WSON-8-1EP_3x2.5mm_P0.5mm_EP1.2x1.5mm_PullBack_ThermalVias; Supplier: http://www.ti.com/lit/ds/symlink/lp3982.pdf
footprint WSON-8-1EP_3x2.5mm_P0.5mm_EP1.2x1.5mm_PullBack_ThermalVias
pins: 1 OUT (power), 2 IN (power), 3 GND (power), 4 OUT hidden, 5 NC (in) hidden, 6 CC, 7 ~{{SHDN}} (in), 8 ~{{FAULT}} (oc), 9 EP

## LP3982ILD-2.5
designator *  value LP3982ILD-2.5
ki_keywords: linear regulator; ki_description: 2.5V, 300mA, Micropower, Ultra-Low-Dropout, Low-Noise CMOS Regulator, WSON-8; ki_fp_filters: WSON*1EP*3x2.5mm*P0.5mm*; Footprint: Package_SON:WSON-8-1EP_3x2.5mm_P0.5mm_EP1.2x1.5mm_PullBack_ThermalVias; Supplier: http://www.ti.com/lit/ds/symlink/lp3982.pdf
footprint WSON-8-1EP_3x2.5mm_P0.5mm_EP1.2x1.5mm_PullBack_ThermalVias
pins: 1 OUT (power), 2 IN (power), 3 GND (power), 4 OUT hidden, 5 NC (in) hidden, 6 CC, 7 ~{{SHDN}} (in), 8 ~{{FAULT}} (oc), 9 EP

## LP3982ILD-3.0
designator *  value LP3982ILD-3.0
ki_keywords: linear regulator; ki_description: 3.0V, 300mA, Micropower, Ultra-Low-Dropout, Low-Noise CMOS Regulator, WSON-8; ki_fp_filters: WSON*1EP*3x2.5mm*P0.5mm*; Footprint: Package_SON:WSON-8-1EP_3x2.5mm_P0.5mm_EP1.2x1.5mm_PullBack_ThermalVias; Supplier: http://www.ti.com/lit/ds/symlink/lp3982.pdf
footprint WSON-8-1EP_3x2.5mm_P0.5mm_EP1.2x1.5mm_PullBack_ThermalVias
pins: 1 OUT (power), 2 IN (power), 3 GND (power), 4 OUT hidden, 5 NC (in) hidden, 6 CC, 7 ~{{SHDN}} (in), 8 ~{{FAULT}} (oc), 9 EP

## LP3982ILD-3.3
designator *  value LP3982ILD-3.3
ki_keywords: linear regulator; ki_description: 3.3V, 300mA, Micropower, Ultra-Low-Dropout, Low-Noise CMOS Regulator, WSON-8; ki_fp_filters: WSON*1EP*3x2.5mm*P0.5mm*; Footprint: Package_SON:WSON-8-1EP_3x2.5mm_P0.5mm_EP1.2x1.5mm_PullBack_ThermalVias; Supplier: http://www.ti.com/lit/ds/symlink/lp3982.pdf
footprint WSON-8-1EP_3x2.5mm_P0.5mm_EP1.2x1.5mm_PullBack_ThermalVias
pins: 1 OUT (power), 2 IN (power), 3 GND (power), 4 OUT hidden, 5 NC (in) hidden, 6 CC, 7 ~{{SHDN}} (in), 8 ~{{FAULT}} (oc), 9 EP

## LP3982ILD-ADJ
designator *  value LP3982ILD-ADJ
ki_keywords: adjustable linear regulator; ki_description: 300mA, Micropower, Ultra-Low-Dropout, Low-Noise Adjustable CMOS Regulator, WSON-8; ki_fp_filters: WSON*1EP*3x2.5mm*P0.5mm*; Footprint: Package_SON:WSON-8-1EP_3x2.5mm_P0.5mm_EP1.2x1.5mm_PullBack_ThermalVias; Supplier: http://www.ti.com/lit/ds/symlink/lp3982.pdf
footprint WSON-8-1EP_3x2.5mm_P0.5mm_EP1.2x1.5mm_PullBack_ThermalVias
pins: 1 OUT (power), 2 IN (power), 3 GND (power), 4 OUT hidden, 5 SET, 6 CC, 7 ~{{SHDN}} (in), 8 ~{{FAULT}} (oc), 9 EP